# Altium footprint library klp.PcbLib: 436 footprints (part 20 of 28)
Each footprint in its own frame and in the unit in brackets; x right, y up, seen from the top. Pads: shape width x height; smd on the part's side, far side on the other; paste and mask are expansions set on the pad; w line width, h text height; cw(c..) or ccw(c..) is an arc to the next point about the centre after c.
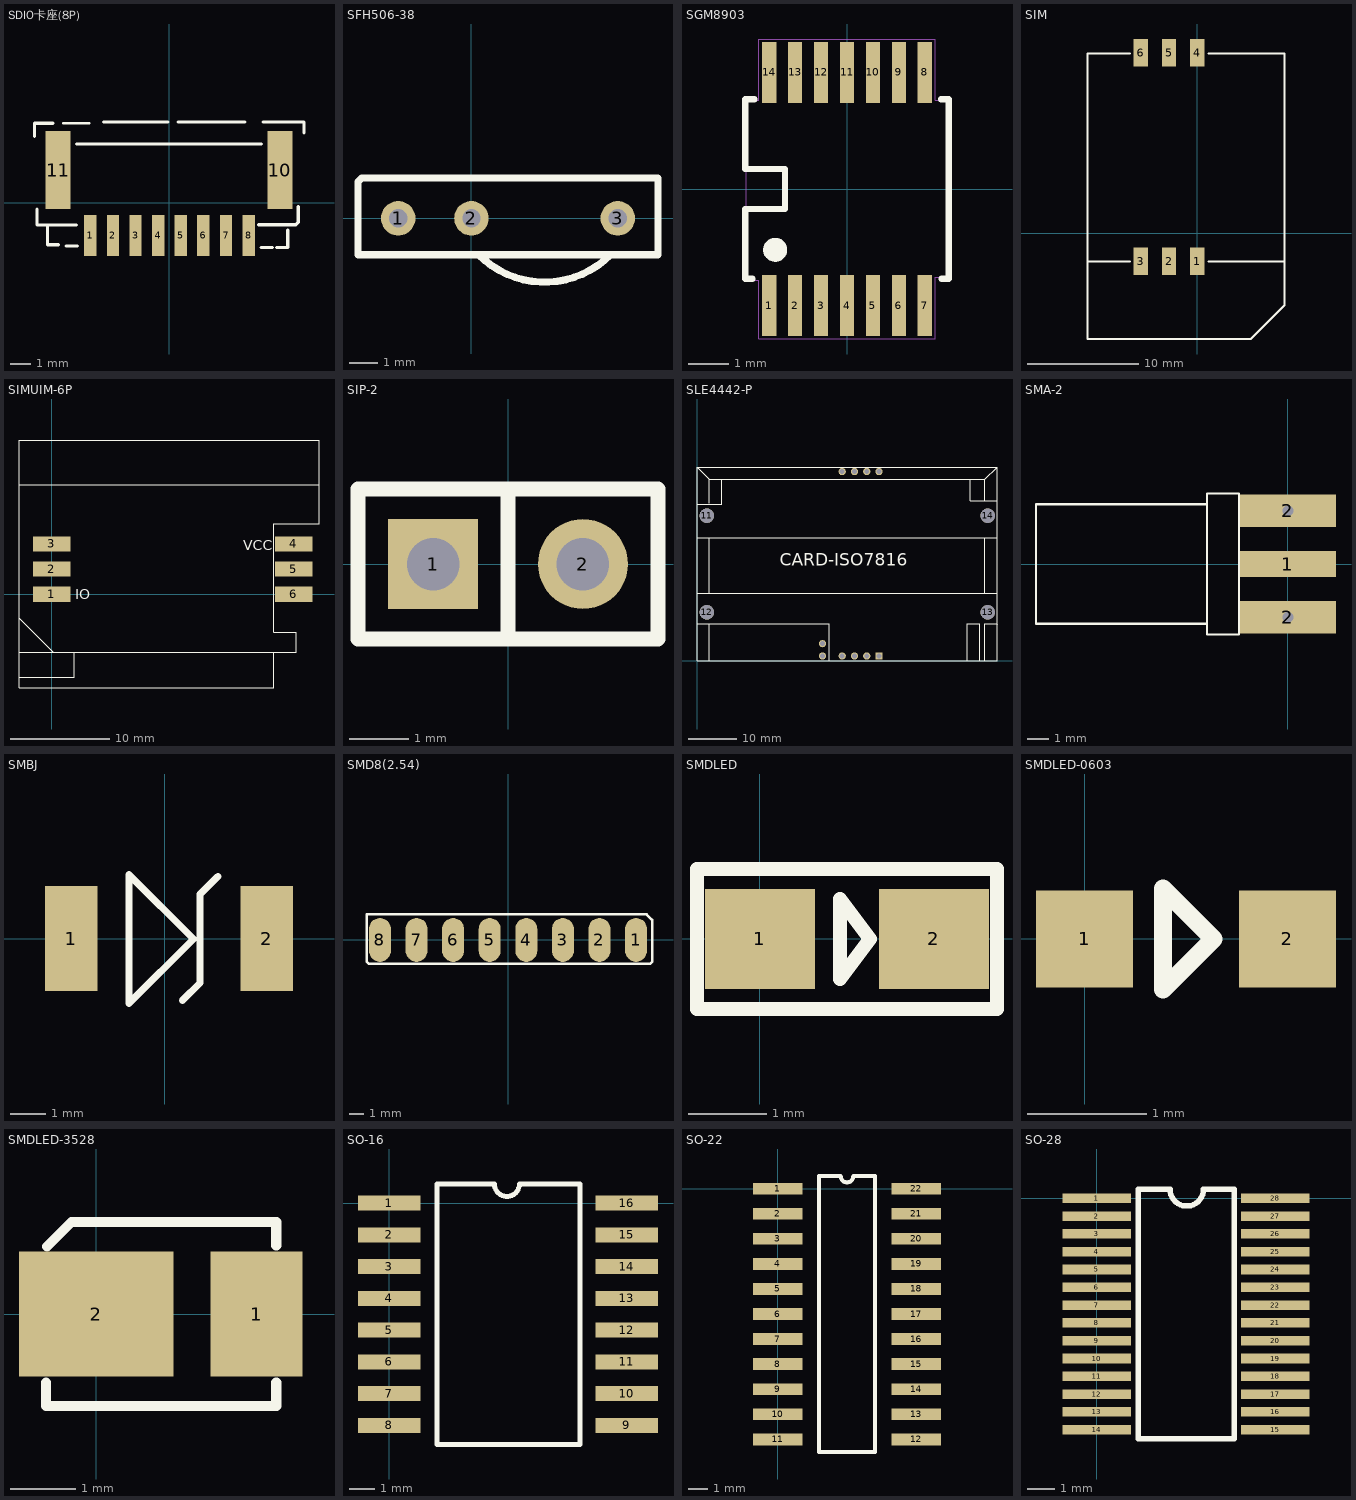
[diagram p19: the footprints below, top view; thin cyan lines are the x and y axes]

## SDIO卡座(8P) [mm]
pads (10):
  rect 0.6x2 smd mask+0.076: 1(-3.826,-1.587) 2(-2.726,-1.587) 3(-1.626,-1.587) 4(-0.526,-1.587) 5(0.573,-1.587) 6(1.673,-1.587) 7(2.773,-1.587) 8(3.873,-1.587)
  rect 1.2x3.8 smd mask+0.076: 10(5.397,1.587) 11(-5.397,1.587)
Top Overlay:
  lines w0.127: -5.143,3.873 -3.873,3.873
  lines w0.152: -6.54,3.238 -6.54,3.873 -5.651,3.873 ; -6.413,-0.296 -6.413,-1.079 -4.508,-1.079 ; -5.905,-1.182 -5.905,-2.042 -5.375,-2.042 ; -5.016,-2.095 -4.456,-2.095 ; -4.508,2.857 4.508,2.857 ; -3.192,3.931 -0.053,3.931 ; 0.447,3.931 3.685,3.931 ; 4.356,-1.069 6.17,-1.069 6.286,-0.953 6.286,-0.191 ; 4.479,-2.169 5.039,-2.169 ; 4.584,3.931 6.574,3.931 6.574,3.403 ; 5.241,-2.169 5.779,-2.169 5.779,-1.337

## SFH506-38 [mm]
height 3.81
pads (3):
  round 1.2 hole 0.635: 1(-2.54,0) 2(0,0) 3(5.08,0)
Top Overlay:
  lines w0.254: -3.429,1.397 -3.81,1.397 ; -3.302,1.397 6.35,1.397 ; -2.413,-1.27 6.477,-1.27 6.477,1.397 5.461,1.397 ; -1.905,1.397 -3.81,1.397 ; 0.254,-1.27 ccw(c2.54,1.016) 4.826,-1.27 ; 6.223,-1.27 -3.937,-1.27 -3.937,1.27 -3.81,1.397

## SGM8903 [mil]
pads (14):
  rect 14x60 smd mask+3: 1(-76.77,-115) 2(-51.18,-115) 3(-25.59,-115) 4(0,-115) 5(25.59,-115) 6(51.18,-115) 7(76.77,-115) 8(76.77,115) 9(51.18,115) 10(25.59,115) 11(0,115) 12(-25.59,115) 13(-51.18,115) 14(-76.77,115)
Top Overlay:
  circle w11.81: c-70.9,-60 r5.9
  lines w6: -93.27,-88.58 -100.39,-88.58 -100.39,-19.69 -61.02,-19.69 -61.02,19.69 -100.39,19.69 -100.39,88.58 -91.41,88.58 ; 92.87,88.58 100.39,88.58 100.39,-88.58 93.08,-88.58
Mechanical 16:
  lines w1: 87.01,90 87.01,87.4 100.39,87.4 100.39,-87.01 87,-87.01 87,-148 -87,-148 -87,-90 -99.61,-90 -99.61,87.4 -87,87.4 -87,148 87,148 87,90 ; 87,90 87.01,90

## SIM [mm]
pads (6):
  rect 1.3x2.5 smd: 1(0,-2.5) 2(-2.55,-2.5) 3(-5.1,-2.5) 4(0,16.306) 5(-2.55,16.306) 6(-5.1,16.306)
Top Overlay:
  lines w0.203: -9.906,-9.525 -9.906,16.25 -6.102,16.25 ; -9.906,-2.54 -6.096,-2.54 ; -9.895,-9.525 3.175,-9.525 ; 1.016,-2.54 7.874,-2.54 ; 1.022,16.25 7.874,16.25 7.874,-6.13 ; 2.54,-9.525 4.826,-9.525 7.874,-6.477 7.874,-5.715 ; 7.874,-5.461 7.874,-1.524

## SIMUIM-6P [mil] "SIM;SAM;"
height 78.74
pads (6):
  rect 150x60 smd: 1(0,0) 2(0,100) 3(0,200) 4(960,200) 5(960,100) 6(960,0)
Top Overlay:
  lines w4: -130,-330 60,-330 90,-330 90,-230 ; -130,-230 60,-230 890,-230 970,-230 970,-150 890,-150 880,-150 880,280 890,280 1060,280 1060,610 -130,610 -130,-95 ; -130,435 1060,435 ; 5,-230 -130,-95 ; 880,-230 880,-370 -130,-370 -130,-95
  text "VCC" at 760,174 h40
  text "IO" at 93,-19 h40

## SIP-2 [mil]
pads (2):
  rect 60x60 hole 35: 1(-50,0)
  round 60 hole 35: 2(50,0)
Top Overlay:
  lines w10: 0,-50 0,50 ; -100,-50 -100,50 100,50 100,-50 -100,-50
3D body "HEADER.STEP": height 298.43, standoff -115.75, extent -100,-50 0,50
3D body "HEADER.STEP": height 298.43, standoff -115.75, extent 0,-50 100,50

## SLE4442-P [mm] "SLE4442CARD,ISO7816"
height 1
pads (14):
  rect 1.5x1.5 hole 1: 1(37.62,1)
  round 1.5 hole 1: 2(35.08,1) 3(32.54,1) 4(30,1) 5(37.62,39.1) 6(35.08,39.1) 7(32.54,39.1) 8(30,39.1) 9(25.936,1) 10(25.936,3.54)
  round 3 hole 3: 11(2.032,30) 12(2.032,10) 13(60.071,10) 14(60.071,30)
Top Overlay:
  lines w0.178: 0,7.62 27.305,7.62 27.305,0 ; 0,13.97 61.873,13.97 ; 0,25.4 62,25.4 ; 0,32.385 5.08,32.385 5.08,37.465 ; 0,39.878 0.127,39.878 2.54,37.465 ; 2.54,0 2.54,7.493 ; 2.54,13.97 2.54,25.4 ; 2.54,32.512 2.54,37.465 ; 55.88,0 55.88,7.62 58.42,7.62 58.42,0 ; 56.515,37.465 56.515,33.02 62,33.02 ; 59.436,0 59.436,7.62 61.873,7.62 62,7.493 ; 59.436,13.97 59.436,25.4 ; 59.436,33.089 59.465,33.118 59.465,37.465 ; 2.54,37.465 59.465,37.465 ; 59.465,37.465 62,40 ; 62,40 0,40 0,0 62,0 62,40
  text "CARD-ISO7816" at 17.145,19.685 h2.54

## SMA-2 [mm]
pads (3):
  rect 4.5x1.2 smd: 1(0,0)
  rect 4.5x1.524 hole 0.5: 2(0,-2.5) 2(0,2.5)
Top Overlay:
  lines w0.1: -3.8,-2.8 -11.8,-2.8 -11.8,2.8 -3.8,2.8 ; -3.8,-3.3 -3.8,3.3 -2.3,3.3 -2.3,-3.3 -3.8,-3.3

## SMBJ [mm]
pads (2):
  rect 1.5x3 smd: 1(-2.667,0) 2(2.921,0)
Top Overlay:
  lines w0.203: 0.508,-1.778 1.016,-1.27 1.016,1.27 1.524,1.778 ; -1.016,-1.854 -1.016,1.829 0.826,-0.013 -1.016,-1.854

## SMD8(2.54) [mil]
pads (8):
  oval 60x120 smd: 1(350,0) 2(250,0) 3(150,0) 4(50,0) 5(-50,0) 6(-150,0) 7(-250,0) 8(-350,0)
Top Overlay:
  lines w7: -386,-60.04 -381,-65.04 389,-65.04 394,-60.04 394,54.96 379,69.96 -386,69.96 -386,-60.04

## SMDLED [mm]
pads (2):
  rect 1.4x1.27 smd: 1(0.001,-0.002) 2(2.211,-0.002)
Top Overlay:
  lines w0.178: 3.012,0.887 3.011,0.887 ; 3.011,0.887 3.011,-0.891 -0.799,-0.891 -0.799,-0.002 -0.799,0.887 3.011,0.887 ; 1.017,-0.51 1.017,0.506 1.398,-0.002 1.017,-0.51

## SMDLED-0603 [mil]
pads (2):
  rect 32x32 smd: 1(0,0) 2(66.93,0)
Top Overlay:
  lines w6: 25.91,-16.61 42.48,-0.04 25.91,16.54 25.91,-0.04 25.91,-16.61

## SMDLED-3528 [mm]
pads (2):
  rect 1.4x1.9 smd: 1(2.438,0)
  rect 2.35x1.9 smd: 2(0,0)
Top Overlay:
  lines w0.152: -0.762,-1.041 -0.762,-1.397 2.738,-1.397 2.738,-1.041 ; -0.749,1.029 -0.375,1.403 2.738,1.403 2.738,1.041

## SO-16 [mm]
pads (16):
  rect 2.5x0.6 smd: 1(0,0) 2(0,-1.27) 3(0,-2.54) 4(0,-3.81) 5(0,-5.08) 6(0,-6.35) 7(0,-7.62) 8(0,-8.89) 9(9.5,-8.89) 10(9.5,-7.62) 11(9.5,-6.35) 12(9.5,-5.08) 13(9.5,-3.81) 14(9.5,-2.54) 15(9.5,-1.27) 16(9.5,0)
Top Overlay:
  lines w0.2: 1.905,-9.652 7.62,-9.652 7.62,0.762 5.207,0.762 cw(c4.707,0.762) 4.207,0.762 1.905,0.762 1.905,-9.652

## SO-22 [mm] "BH1417"
height 2
pads (22):
  rect 2.5x0.6 smd: 1(0,0) 2(0,-1.27) 3(0,-2.54) 4(0,-3.81) 5(0,-5.08) 6(0,-6.35) 7(0,-7.62) 8(0,-8.89) 9(0,-10.16) 10(0,-11.43) 11(0,-12.7) 12(7,-12.7) 13(7,-11.43) 14(7,-10.16) 15(7,-8.89) 16(7,-7.62) 17(7,-6.35) 18(7,-5.08) 19(7,-3.81) 20(7,-2.54) 21(7,-1.27) 22(7,0)
Top Overlay:
  lines w0.2: 2.085,-13.335 4.915,-13.335 4.915,0.635 3.818,0.635 cw(c3.5,0.635) 3.183,0.635 2.085,0.635 2.085,-13.335

## SO-28 [mm] "PCM2702"
height 2
pads (28):
  rect 2.5x0.35 smd: 1(0,0) 2(0,-0.65) 3(0,-1.3) 4(0,-1.95) 5(0,-2.6) 6(0,-3.25) 7(0,-3.9) 8(0,-4.55) 9(0,-5.2) 10(0,-5.85) 11(0,-6.5) 12(0,-7.15) 13(0,-7.8) 14(0,-8.45) 15(6.5,-8.45) 16(6.5,-7.8) 17(6.5,-7.15) 18(6.5,-6.5) 19(6.5,-5.85) 20(6.5,-5.2) 21(6.5,-4.55) 22(6.5,-3.9) 23(6.5,-3.25) 24(6.5,-2.6) 25(6.5,-1.95) 26(6.5,-1.3) 27(6.5,-0.65) 28(6.5,0)
Top Overlay:
  lines w0.2: 4.992,-8.775 1.501,-8.775 1.501,0.325 2.667,0.325 ccw(c3.277,0.325) 3.886,0.325 4.999,0.325 ; 5.004,-8.77 5.004,0.33